# Altium footprint library HDR2.54.PcbLib: 242 footprints (part 14 of 16)
Each footprint in its own frame and in the unit in brackets; x right, y up, seen from the top. Pads: shape width x height; smd on the part's side, far side on the other; paste and mask are expansions set on the pad; w line width, h text height; cw(c..) or ccw(c..) is an arc to the next point about the centre after c.
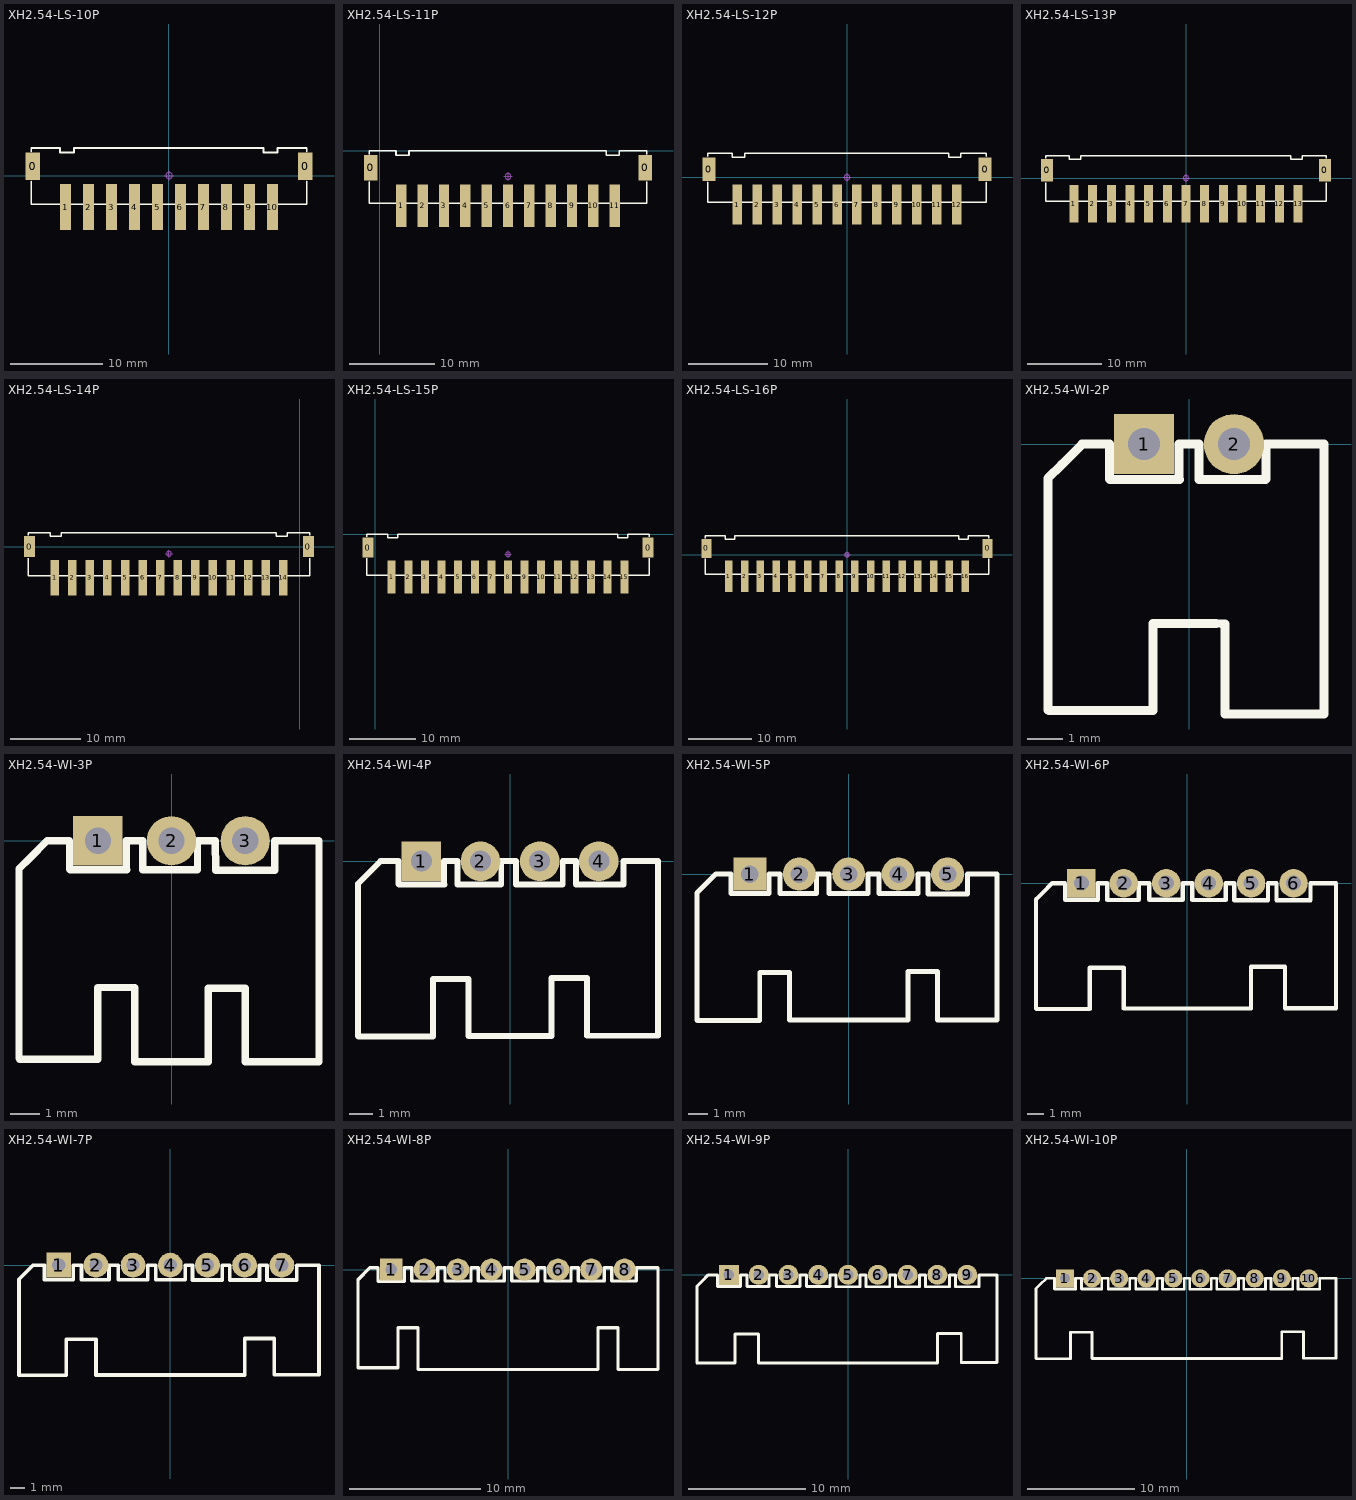
[diagram p13: the footprints below, top view; thin cyan lines are the x and y axes]

## XH2.54-LS-10P [mm] "����30mm�����6mm���ߣ�8.3mm  �Ա�ID:�ƾ���ʯ   ������ַ:https://shop463601444.taobao.com"
pads (12):
  rect 1.6x3 smd: 0(-14.826,1.016) 0(14.826,1.016)
  rect 1.2x5 smd: 1(-11.25,-3.433) 2(-8.75,-3.433) 3(-6.25,-3.433) 4(-3.75,-3.433) 5(-1.25,-3.433) 6(1.25,-3.433) 7(3.75,-3.433) 8(6.25,-3.433) 9(8.75,-3.433) 10(11.25,-3.433)
Top Overlay:
  lines w0.2: -15,-0.625 -15,-3.125 15,-3.125 15,-0.625 ; -15,2.625 -15,3 -11.878,3 -11.878,2.5 -10.354,2.5 -10.354,3 10.274,3 10.274,2.5 11.798,2.5 11.798,3 15,3 15,2.625
Mechanical 15:
  circle w0.05: c0,0 r0.35
  lines w0.05: -0.5,0 0.5,0 ; 0,-0.5 0,0.5
3D body "XH2.54-LS-10P.STEP": height 8, standoff 0, extent -15,-6 15,3

## XH2.54-LS-11P [mm] "����32.5mm�����6mm���ߣ�8.3mm  �Ա�ID:�ƾ���ʯ   ������ַ:https://shop463601444.taobao.com"
pads (13):
  rect 1.6x3 smd: 0(-1.076,-1.984) 0(31.076,-1.984)
  rect 1.2x5 smd: 1(2.5,-6.433) 2(5,-6.433) 3(7.5,-6.433) 4(10,-6.433) 5(12.5,-6.433) 6(15,-6.433) 7(17.5,-6.433) 8(20,-6.433) 9(22.5,-6.433) 10(25,-6.433) 11(27.5,-6.433)
Top Overlay:
  lines w0.2: -1.25,-3.625 -1.25,-6.125 31.25,-6.125 31.25,-3.625 ; -1.25,-0.375 -1.25,0 1.872,0 1.872,-0.5 3.396,-0.5 3.396,0 26.524,0 26.524,-0.5 28.048,-0.5 28.048,0 31.25,0 31.25,-0.375
Mechanical 15:
  circle w0.05: c15,-3 r0.35
  lines w0.05: 14.5,-3 15.5,-3 ; 15,-3.5 15,-2.5
3D body "XH2.54-LS-11P.STEP": height 8, standoff 0, extent -1.25,-9 31.25,0

## XH2.54-LS-12P [mm] "����35mm�����6mm���ߣ�8.3mm  �Ա�ID:�ƾ���ʯ   ������ַ:https://shop463601444.taobao.com"
pads (14):
  rect 1.6x3 smd: 0(-17.326,1.016) 0(17.326,1.016)
  rect 1.2x5 smd: 1(-13.75,-3.433) 2(-11.25,-3.433) 3(-8.75,-3.433) 4(-6.25,-3.433) 5(-3.75,-3.433) 6(-1.25,-3.433) 7(1.25,-3.433) 8(3.75,-3.433) 9(6.25,-3.433) 10(8.75,-3.433) 11(11.25,-3.433) 12(13.75,-3.433)
Top Overlay:
  lines w0.2: -17.5,-0.625 -17.5,-3.125 17.5,-3.125 17.5,-0.625 ; -17.5,2.625 -17.5,3 -14.378,3 -14.378,2.5 -12.854,2.5 -12.854,3 12.774,3 12.774,2.5 14.298,2.5 14.298,3 17.5,3 17.5,2.625
Mechanical 15:
  circle w0.05: c0,0 r0.35
  lines w0.05: -0.5,0 0.5,0 ; 0,-0.5 0,0.5
3D body "XH2.54-LS-12P.STEP": height 8, standoff 0, extent -17.5,-6 17.5,3

## XH2.54-LS-13P [mm] "����37.5mm�����6mm���ߣ�8.3mm   �Ա�ID:�ƾ���ʯ   ������ַ:https://shop463601444.taobao.com"
pads (15):
  rect 1.6x3 smd: 0(-18.576,1.016) 0(18.576,1.016)
  rect 1.2x5 smd: 1(-15,-3.433) 2(-12.5,-3.433) 3(-10,-3.433) 4(-7.5,-3.433) 5(-5,-3.433) 6(-2.5,-3.433) 7(0,-3.433) 8(2.5,-3.433) 9(5,-3.433) 10(7.5,-3.433) 11(10,-3.433) 12(12.5,-3.433) 13(15,-3.433)
Top Overlay:
  lines w0.2: -18.75,-0.625 -18.75,-3.125 18.75,-3.125 18.75,-0.625 ; -18.75,2.625 -18.75,3 -15.628,3 -15.628,2.5 -14.104,2.5 -14.104,3 14.024,3 14.024,2.5 15.548,2.5 15.548,3 18.75,3 18.75,2.625
Mechanical 15:
  circle w0.05: c0,0 r0.35
  lines w0.05: -0.5,0 0.5,0 ; 0,-0.5 0,0.5
3D body "XH2.54-LS-13P.STEP": height 8, standoff 0, extent -18.75,-6 18.75,3

## XH2.54-LS-14P [mm] "����40mm�����6mm���ߣ�8.3mm   �Ա�ID:�ƾ���ʯ   ������ַ:https://shop463601444.taobao.com"
pads (16):
  rect 1.6x3 smd: 0(-38.402,0) 0(1.25,0)
  rect 1.2x5 smd: 1(-34.826,-4.449) 2(-32.326,-4.449) 3(-29.826,-4.449) 4(-27.326,-4.449) 5(-24.826,-4.449) 6(-22.326,-4.449) 7(-19.826,-4.449) 8(-17.326,-4.449) 9(-14.826,-4.449) 10(-12.326,-4.449) 11(-9.826,-4.449) 12(-7.326,-4.449) 13(-4.826,-4.449) 14(-2.326,-4.449)
Top Overlay:
  lines w0.2: -38.576,-1.641 -38.576,-4.141 1.424,-4.141 1.424,-1.641 ; -38.576,1.609 -38.576,1.984 -35.454,1.984 -35.454,1.484 -33.93,1.484 -33.93,1.984 -3.302,1.984 -3.302,1.484 -1.778,1.484 -1.778,1.984 1.424,1.984 1.424,1.609
Mechanical 15:
  circle w0.05: c-18.576,-1.016 r0.35
  lines w0.05: -19.076,-1.016 -18.076,-1.016 ; -18.576,-1.516 -18.576,-0.516
3D body "XH2.54-LS-14P.STEP": height 8, standoff 0, extent -38.576,-7.016 1.424,1.984

## XH2.54-LS-15P [mm] "����42.5mm�����6mm���ߣ�8.3mm  �Ա�ID:�ƾ���ʯ   ������ַ:https://shop463601444.taobao.com"
pads (17):
  rect 1.6x3 smd: 0(-1.076,-1.984) 0(41.076,-1.984)
  rect 1.2x5 smd: 1(2.5,-6.433) 2(5,-6.433) 3(7.5,-6.433) 4(10,-6.433) 5(12.5,-6.433) 6(15,-6.433) 7(17.5,-6.433) 8(20,-6.433) 9(22.5,-6.433) 10(25,-6.433) 11(27.5,-6.433) 12(30,-6.433) 13(32.5,-6.433) 14(35,-6.433) 15(37.5,-6.433)
Top Overlay:
  lines w0.2: -1.25,-3.625 -1.25,-6.125 41.25,-6.125 41.25,-3.625 ; -1.25,-0.375 -1.25,0 1.872,0 1.872,-0.5 3.396,-0.5 3.396,0 36.524,0 36.524,-0.5 38.048,-0.5 38.048,0 41.25,0 41.25,-0.375
Mechanical 15:
  circle w0.05: c20,-3 r0.35
  lines w0.05: 19.5,-3 20.5,-3 ; 20,-3.5 20,-2.5
3D body "XH2.54-LS-15P.STEP": height 8, standoff 0, extent -1.25,-9 41.25,0

## XH2.54-LS-16P [mm] "����45mm�����6mm���ߣ�8.3mm    �Ա�ID:�ƾ���ʯ   ������ַ:https://shop463601444.taobao.com"
pads (18):
  rect 1.6x3 smd: 0(-22.326,1.016) 0(22.326,1.016)
  rect 1.2x5 smd: 1(-18.75,-3.433) 2(-16.25,-3.433) 3(-13.75,-3.433) 4(-11.25,-3.433) 5(-8.75,-3.433) 6(-6.25,-3.433) 7(-3.75,-3.433) 8(-1.25,-3.433) 9(1.25,-3.433) 10(3.75,-3.433) 11(6.25,-3.433) 12(8.75,-3.433) 13(11.25,-3.433) 14(13.75,-3.433) 15(16.25,-3.433) 16(18.75,-3.433)
Top Overlay:
  lines w0.2: -22.5,-0.625 -22.5,-3.125 22.5,-3.125 22.5,-0.625 ; -22.5,2.625 -22.5,3 -19.378,3 -19.378,2.5 -17.854,2.5 -17.854,3 17.774,3 17.774,2.5 19.298,2.5 19.298,3 22.5,3 22.5,2.625
Mechanical 15:
  circle w0.05: c0,0 r0.35
  lines w0.05: -0.5,0 0.5,0 ; 0,-0.5 0,0.5
3D body "XH2.54-LS-16P.STEP": height 8, standoff 0, extent -22.5,-6 22.5,3

## XH2.54-WI-2P [mm] "�Ӳ����2P"
pads (2):
  rect 1.7x1.7 hole 0.9: 1(-1.27,0)
  round 1.7 hole 0.9: 2(1.27,0)
Top Overlay:
  lines w0.254: 2.164,0 2.164,-0.988 2.15,-1.002 0.284,-1.002 0.284,0 -0.288,0 -0.288,-0.982 -0.274,-0.996 -2.23,-0.996 -2.244,-0.982 -2.244,0 -3.02,0 -3.602,-0.582 -3.986,-0.966 -3.986,-7.502 -3.96,-7.528 -1.016,-7.528 -1.016,-5.058 0.762,-5.058 1.016,-5.08 1.016,-7.62 1.27,-7.62 3.81,-7.62 3.81,0 2.774,0 2.176,0
3D body "XH2.54-2P_H.STEP": height 5.73, standoff -3.37, extent -3.77,-7.35 3.77,0.35

## XH2.54-WI-3P [mm] "�Ӳ����3P"
pads (3):
  rect 1.7x1.7 hole 0.9: 1(-2.54,0)
  round 1.7 hole 0.9: 2(0,0) 3(2.54,0)
Top Overlay:
  lines w0.254: 0.894,0 0.894,-0.988 0.88,-1.002 -0.986,-1.002 -0.986,0 -1.558,0 -1.558,-0.982 -1.544,-0.996 -3.5,-0.996 -3.514,-0.982 -3.514,0 -4.29,0 -4.872,-0.582 -5.256,-0.966 -5.256,-7.502 -5.23,-7.528 -2.54,-7.528 -2.54,-5.058 -1.27,-5.058 -1.27,-7.62 0,-7.62 1.27,-7.62 1.27,-5.08 2.54,-5.08 2.54,-7.62 5.08,-7.62 5.08,0 4.044,0 3.556,0 3.556,-1.016 1.524,-1.016 1.504,0 0.906,0
3D body "XH2.54-3P_H.STEP": height 5.73, standoff -3.37, extent -5.04,-7.35 5.04,0.35

## XH2.54-WI-4P [mm] "�Ӳ����4P"
pads (4):
  rect 1.7x1.7 hole 0.9: 1(-3.81,0)
  round 1.7 hole 0.9: 2(-1.27,0) 3(1.27,0) 4(3.81,0)
Top Overlay:
  lines w0.254: -0.376,0 -0.376,-0.988 -0.39,-1.002 -2.256,-1.002 -2.256,0 -2.828,0 -2.828,-0.982 -2.814,-0.996 -4.77,-0.996 -4.784,-0.982 -4.784,0 -5.56,0 -6.142,-0.582 -6.526,-0.966 -6.526,-7.502 -6.5,-7.528 -3.302,-7.528 -3.302,-5.058 -1.778,-5.058 -1.778,-7.502 1.778,-7.502 1.778,-5.006 3.302,-5.006 3.302,-7.49 6.35,-7.49 6.35,0 4.916,0 ; -0.364,0 0.234,0 ; 0.248,-0.996 0.248,0 ; 0.268,-0.996 2.256,-0.996 2.262,-0.99 2.262,0 2.808,0 ; 2.822,0 2.822,-1.002 4.876,-1.002 ; 4.876,-0.976 4.876,0
3D body "XH2.54-4P_H.STEP": height 5.73, standoff -3.37, extent -6.31,-7.35 6.31,0.35

## XH2.54-WI-5P [mm] "�Ӳ����5P"
pads (5):
  rect 1.7x1.7 hole 0.9: 1(-5.08,0)
  round 1.7 hole 0.9: 2(-2.54,0) 3(0,0) 4(2.54,0) 5(5.08,0)
Top Overlay:
  lines w0.254: -1.646,0 -1.646,-0.988 -1.66,-1.002 -3.526,-1.002 -3.526,0 -4.098,0 -4.098,-0.982 -4.084,-0.996 -6.04,-0.996 -6.054,-0.982 -6.054,0 -6.83,0 -7.412,-0.582 -7.796,-0.966 -7.796,-7.502 -7.77,-7.528 -4.572,-7.528 -4.572,-5.058 -3.048,-5.058 -3.048,-7.502 3.048,-7.502 3.048,-5.006 4.572,-5.006 4.572,-7.49 7.62,-7.49 7.62,0 6.096,0 6.096,-1.016 4.064,-1.016 4.064,0 3.556,0 3.556,-1.002 1.552,-1.002 1.552,0 ; -1.634,0 -1.036,0 ; -1.022,-0.996 -1.022,0 ; -1.002,-0.996 0.986,-0.996 0.992,-0.99 0.992,0 1.538,0
3D body "XH2.54-5P_H.STEP": height 5.73, standoff -3.37, extent -7.58,-7.35 7.58,0.35

## XH2.54-WI-6P [mm] "�Ӳ����6P"
pads (6):
  rect 1.7x1.7 hole 0.9: 1(-6.35,0)
  round 1.7 hole 0.9: 2(-3.81,0) 3(-1.27,0) 4(1.27,0) 5(3.81,0) 6(6.35,0)
Top Overlay:
  lines w0.254: -2.916,0 -2.916,-0.988 -2.93,-1.002 -4.796,-1.002 -4.796,0 -5.368,0 -5.368,-0.982 -5.354,-0.996 -7.31,-0.996 -7.324,-0.982 -7.324,0 -8.1,0 -8.682,-0.582 -9.066,-0.966 -9.066,-7.502 -9.04,-7.528 -5.842,-7.528 -5.842,-5.058 -3.81,-5.058 -3.81,-7.502 3.81,-7.502 3.81,-5.006 5.842,-5.006 5.842,-7.49 8.89,-7.49 8.89,0 7.366,0 7.366,-1.016 5.334,-1.016 5.334,0 4.826,0 4.826,-1.016 2.794,-1.016 2.794,0 2.286,0 2.286,-1.002 0.282,-1.002 0.282,0 ; -2.904,0 -2.306,0 ; -2.292,-0.996 -2.292,0 ; -2.272,-0.996 -0.284,-0.996 -0.278,-0.99 -0.278,0 0.268,0
3D body "XH2.54-6P_H.STEP": height 5.75, standoff -3.35, extent -8.85,-7.35 8.85,0.35

## XH2.54-WI-7P [mm] "�Ӳ����7P"
pads (7):
  rect 1.7x1.7 hole 0.9: 1(-7.62,0)
  round 1.7 hole 0.9: 2(-5.08,0) 3(-2.54,0) 4(0,0) 5(2.54,0) 6(5.08,0) 7(7.62,0)
Top Overlay:
  lines w0.254: -4.186,0 -4.186,-0.988 -4.2,-1.002 -6.066,-1.002 -6.066,0 -6.638,0 -6.638,-0.982 -6.624,-0.996 -8.58,-0.996 -8.594,-0.982 -8.594,0 -9.37,0 -9.952,-0.582 -10.336,-0.966 -10.336,-7.502 -10.31,-7.528 -7.112,-7.528 -7.112,-5.058 -5.08,-5.058 -5.08,-7.502 5.08,-7.502 5.08,-5.006 7.112,-5.006 7.112,-7.49 10.16,-7.49 10.16,0 8.636,0 8.636,-1.016 6.604,-1.016 6.604,0 6.096,0 6.096,-1.016 4.064,-1.016 4.064,0 3.556,0 3.556,-1.016 1.524,-1.016 1.524,0 1.016,0 1.016,-1.002 -0.988,-1.002 -0.988,0 ; -4.174,0 -3.576,0 ; -3.562,-0.996 -3.562,0 ; -3.542,-0.996 -1.554,-0.996 -1.548,-0.99 -1.548,0 -1.002,0
3D body "XH2.54-7P_H.STEP": height 5.75, standoff -3.35, extent -10.12,-7.35 10.12,0.35

## XH2.54-WI-8P [mm] "�Ӳ����8P"
pads (8):
  rect 1.7x1.7 hole 0.9: 1(-8.89,0)
  round 1.7 hole 0.9: 2(-6.35,0) 3(-3.81,0) 4(-1.27,0) 5(1.27,0) 6(3.81,0) 7(6.35,0) 8(8.89,0)
Top Overlay:
  lines w0.254: -7.352,0.127 -7.898,0.127 -7.898,-0.889 -9.906,-0.889 -9.906,0.127 -10.541,0.127 -11.43,-0.762 -11.43,-7.485 -8.382,-7.485 -8.382,-4.445 -6.858,-4.445 -6.858,-7.62 6.858,-7.62 6.858,-4.445 8.382,-4.445 8.382,-7.62 11.43,-7.62 11.43,0.127 9.779,0.127 9.779,-0.762 9.779,-0.875 7.902,-0.875 7.902,0.127 ; -7.338,0.127 -7.338,-0.875 -5.37,-0.875 -5.358,-0.863 -5.358,0.127 -4.812,0.127 ; -4.798,0.127 -4.798,-0.875 -2.83,-0.875 -2.818,-0.863 -2.818,0.127 -2.272,0.127 ; -2.258,0.127 -2.258,-0.875 -0.29,-0.875 -0.278,-0.863 -0.278,0.127 0.268,0.127 ; 0.282,0.127 0.282,-0.875 2.25,-0.875 2.262,-0.863 2.262,0.127 2.808,0.127 ; 2.822,0.127 2.822,-0.875 4.79,-0.875 4.802,-0.863 4.802,0.127 5.348,0.127 ; 5.362,0.127 5.362,-0.875 7.33,-0.875 7.342,-0.863 7.342,0.127 7.888,0.127
3D body "XH2.54-8P_H.STEP": height 5.75, standoff -3.35, extent -11.39,-7.35 11.39,0.35

## XH2.54-WI-9P [mm] "�Ӳ����9P"
pads (9):
  rect 1.7x1.7 hole 0.9: 1(-10.16,0)
  round 1.7 hole 0.9: 2(-7.62,0) 3(-5.08,0) 4(-2.54,0) 5(0,0) 6(2.54,0) 7(5.08,0) 8(7.62,0) 9(10.16,0)
Top Overlay:
  lines w0.254: -6.726,0 -6.726,-0.988 -6.74,-1.002 -8.606,-1.002 -8.606,0 -9.178,0 -9.178,-0.982 -9.164,-0.996 -11.12,-0.996 -11.134,-0.982 -11.134,0 -11.91,0 -12.492,-0.582 -12.876,-0.966 -12.876,-7.502 -12.85,-7.528 -9.652,-7.528 -9.652,-5.058 -7.62,-5.058 -7.62,-7.502 7.62,-7.502 7.62,-5.006 9.652,-5.006 9.652,-7.49 12.7,-7.49 12.7,0 11.176,0 11.176,-1.016 9.144,-1.016 9.144,0 8.636,0 8.636,-1.016 6.604,-1.016 6.604,0 6.096,0 6.096,-1.016 4.064,-1.016 4.064,0 3.556,0 3.556,-1.016 1.524,-1.016 1.524,0 1.016,0 1.016,-1.016 -1.016,-1.016 -1.016,0 -1.524,0 -1.524,-1.002 -3.528,-1.002 -3.528,0 ; -6.714,0 -6.116,0 ; -6.102,-0.996 -6.102,0 ; -6.082,-0.996 -4.094,-0.996 -4.088,-0.99 -4.088,0 -3.542,0
3D body "XH2.54-9P_H.STEP": height 5.75, standoff -3.35, extent -12.66,-7.35 12.66,0.35

## XH2.54-WI-10P [mm] "�Ӳ����10P"
pads (10):
  rect 1.7x1.7 hole 0.9: 1(-11.43,0)
  round 1.7 hole 0.9: 2(-8.89,0) 3(-6.35,0) 4(-3.81,0) 5(-1.27,0) 6(1.27,0) 7(3.81,0) 8(6.35,0) 9(8.89,0) 10(11.43,0)
Top Overlay:
  lines w0.254: -7.996,0 -7.996,-0.988 -8.01,-1.002 -9.876,-1.002 -9.876,0 -10.448,0 -10.448,-0.982 -10.434,-0.996 -12.39,-0.996 -12.404,-0.982 -12.404,0 -13.18,0 -13.762,-0.582 -14.146,-0.966 -14.146,-7.502 -14.12,-7.528 -10.922,-7.528 -10.922,-5.058 -8.89,-5.058 -8.89,-7.502 8.89,-7.502 8.89,-5.006 10.922,-5.006 10.922,-7.49 13.97,-7.49 13.97,0 12.446,0 12.446,-1.016 10.414,-1.016 10.414,0 9.906,0 9.906,-1.016 7.874,-1.016 7.874,0 7.366,0 7.366,-1.016 5.334,-1.016 5.334,0 4.826,0 4.826,-1.016 2.794,-1.016 2.794,0 2.286,0 2.286,-1.016 0.254,-1.016 0.254,0 -0.254,0 -0.254,-1.016 -2.286,-1.016 -2.286,0 -2.794,0 -2.794,-1.002 -4.798,-1.002 -4.798,0 ; -7.984,0 -7.386,0 ; -7.372,-0.996 -7.372,0 ; -7.352,-0.996 -5.364,-0.996 -5.358,-0.99 -5.358,0 -4.812,0
3D body "XH2.54-10P_H.STEP": height 5.73, standoff -3.37, extent -13.93,-7.35 13.93,0.35